# Altium footprint library USB Connectors.PcbLib: 40 footprints (part 3 of 3)
Each footprint in its own frame and in the unit in brackets; x right, y up, seen from the top. Pads: shape width x height; smd on the part's side, far side on the other; paste and mask are expansions set on the pad; w line width, h text height; cw(c..) or ccw(c..) is an arc to the next point about the centre after c.
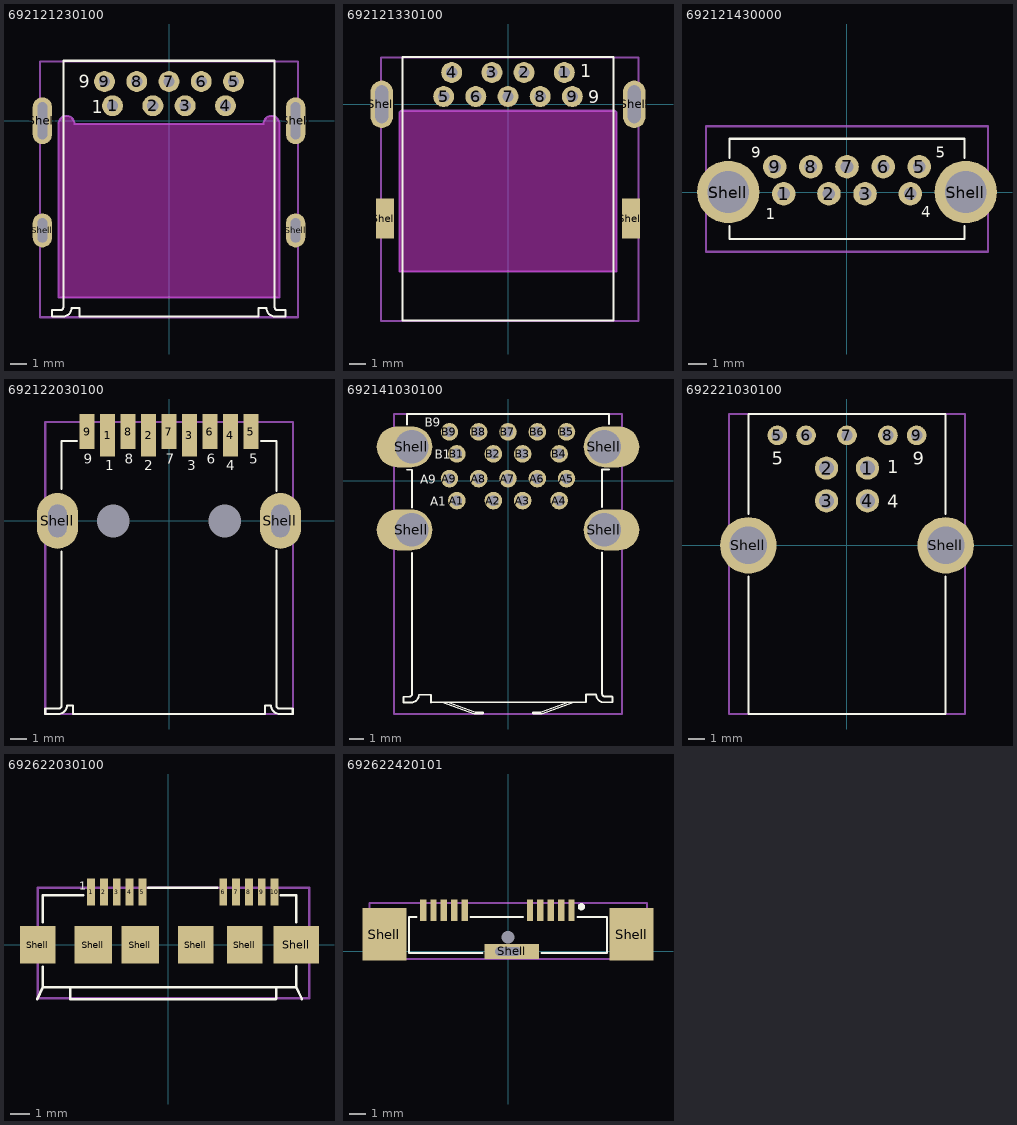
[diagram p2: the footprints below, top view; thin cyan lines are the x and y axes]

## 692121230100 [mm] "Receptacle Through hole Offset 1.04mm"
height 3.9
pads (13):
  round 1.3 hole 0.7: 1(-3.5,0.93) 2(-1,0.93) 3(1,0.93) 4(3.5,0.93) 5(4,2.43) 6(2,2.43) 7(0,2.43) 8(-2,2.43) 9(-4,2.43)
  oval 1.2x2.1 hole 0.6 slot 1.5 at 90 deg: Shell(-7.85,-6.8) Shell(7.85,-6.8)
  oval 1.2x2.9 hole 0.6 slot 2.3 at 90 deg: Shell(-7.85,0) Shell(7.85,0)
Top Overlay:
  lines w0.127: -7.25,-12.142 -6.577,-12.142 ccw(c-6.577,-11.616) -6.05,-11.616 -5.55,-11.616 -5.55,-12.15 5.55,-12.15 5.55,-11.616 6.05,-11.616 ccw(c6.576,-11.616) 6.576,-12.142 7.23,-12.142 7.23,-11.747 6.747,-11.747 cw(c6.747,-11.55) 6.55,-11.55 6.55,3.72 -6.55,3.72 -6.55,-11.55 cw(c-6.748,-11.55) -6.748,-11.747 -7.25,-11.747 -7.25,-12.142
  text "1" at -4.8,0.45 h0.8
  text "9" at -5.6,2.05 h0.8
Keep-Out Layer:
  board cut-out: -6.85,-10.97 6.85,-10.97 6.86,-0.2 6.821,-0.005 6.71,0.16 6.545,0.271 6.35,0.31 6.155,0.271 5.99,0.16 5.879,-0.005 5.84,-0.2 5.85,-0.2 -5.84,-0.2 -5.879,-0.005 -5.99,0.16 -6.155,0.271 -6.35,0.31 -6.545,0.271 -6.71,0.16 -6.821,-0.005 -6.86,-0.2 -6.85,-0.2
Mechanical 1:
  text "Milling Area" at -3.6,-6.77 h1.52
Mechanical 13:
  lines w0.127: -8,-12.185 8,-12.185 8,3.685 -8,3.685 -8,-12.185 ; -6.85,-10.97 6.85,-10.97 6.85,-0.2 ccw(c6.35,-0.2) 5.85,-0.2 -5.85,-0.2 ccw(c-6.35,-0.2) -6.85,-0.2 -6.85,-10.97
3D body: height 2.09, standoff -5.03, extent -8,-12.185 8,3.685

## 692121330100 [mm] "Receptacle TH Reverse Offset 1.75mm"
height 4.54
pads (13):
  round 1.3 hole 0.7: 1(3.5,1.98) 2(1,1.98) 3(-1,1.98) 4(-3.5,1.98) 5(-4,0.48) 6(-2,0.48) 7(0,0.48) 8(2,0.48) 9(4,0.48)
  oval 1.4x2.95 hole 0.8 slot 2.35 at 90 deg: Shell(-7.85,0) Shell(7.85,0)
  rect 1.1x2.5 smd: Shell(-7.65,-7.1) Shell(7.65,-7.1)
Top Overlay:
  lines w0.127: -6.55,-13.43 6.55,-13.43 ; -6.55,-13.43 6.55,-13.43 ; -6.55,-13.43 -6.55,2.94 ; -6.55,2.94 6.55,2.94 ; -6.55,2.94 6.55,2.94 ; 6.55,-13.43 6.55,2.94
  text "1" at 4.5,1.68 h0.8
  text "9" at 5,0.08 h0.8
Keep-Out Layer:
  board cut-out: -6.75,-10.4 -6.75,-0.57 -6.753,-0.57 -6.74,-0.504 -6.703,-0.447 -6.646,-0.41 -6.58,-0.397 -6.58,-0.4 6.58,-0.4 6.58,-0.397 6.646,-0.41 6.703,-0.447 6.74,-0.504 6.753,-0.57 6.75,-0.57 6.75,-10.4
Mechanical 1:
  text "Milling Area" at -3,-5.5 h1.52
Mechanical 13:
  lines w0.127: -7.9,-13.47 -7.9,2.9 8.1,2.9 8.1,-13.47 -7.9,-13.47 ; -6.75,-10.4 -6.75,-0.57 cw(c-6.58,-0.57) -6.58,-0.4 6.58,-0.4 cw(c6.58,-0.57) 6.75,-0.57 6.75,-10.4 -6.75,-10.4
3D body: height 2.95, standoff -4.45, extent -7.9,-13.47 8.1,2.9

## 692121430000 [mm] "Receptacle Through hole"
height 15
pads (11):
  round 1.3 hole 0.7: 1(-3.5,-0.1) 2(-1,-0.1) 3(1,-0.1) 4(3.5,-0.1) 5(4,1.4) 6(2,1.4) 7(0,1.4) 8(-2,1.4) 9(-4,1.4)
  round 3.45 hole 2.3: Shell(-6.57,0) Shell(6.57,0)
Top Overlay:
  lines w0.127: -6.5,-1.9 -6.5,-2.6 6.5,-2.6 6.5,-1.9 ; -6.5,1.9 -6.5,2.95 6.5,2.95 6.5,1.9
  text "9" at -5.3,1.9 h0.6
  text "5" at 4.9,1.9 h0.6
  text "4" at 4.1,-1.4 h0.6
  text "1" at -4.5,-1.5 h0.6
Mechanical 13:
  lines w0.127: -7.8,-3.3 7.8,-3.3 7.8,3.635 -7.799,3.635 -7.8,3.634 -7.8,-3.3
3D body: height 15.01, standoff -3.76, extent -7.799,-3.315 7.799,3.635

## 692122030100 [mm] "Receptacle Dual port TH"
height 6.99
pads (13):
  rect 0.9x2.6 smd: 1(-3.75,5.22) 2(-1.25,5.22) 3(1.25,5.22) 4(3.75,5.22)
  rect 0.9x2.15 smd: 5(5,5.445) 6(2.5,5.445) 7(0,5.445) 8(-2.5,5.445) 9(-5,5.445)
  oval 2.52x3.4 hole 1.12 slot 2 at 90 deg: Shell(-6.8,0) Shell(6.8,0)
  round 1.8 hole 2 unplated: ""(-3.4,0) ""(3.4,0)
Top Overlay:
  lines w0.127: -6.55,-1.867 -6.55,-11.251 cw(c-6.755,-11.251) -6.755,-11.456 -7.55,-11.456 -7.55,-11.777 -6.754,-11.777 ccw(c-6.754,-11.251) -6.228,-11.251 -5.85,-11.251 -5.85,-11.777 5.85,-11.777 5.85,-11.251 6.228,-11.251 ccw(c6.754,-11.251) 6.754,-11.777 7.55,-11.777 7.55,-11.456 6.755,-11.456 cw(c6.755,-11.251) 6.55,-11.251 6.55,-1.817 ; -6.55,1.932 -6.55,4.873 -5.6,4.873 ; 5.6,4.873 6.55,4.873 6.55,1.833
  text "1" at -3.9,3.1 h0.6
  text "2" at -1.5,3.1 h0.6
  text "3" at 1.1,3.1 h0.6
  text "4" at 3.5,3.1 h0.6
  text "5" at 4.9,3.5 h0.6
  text "6" at 2.3,3.5 h0.6
  text "7" at -0.2,3.5 h0.6
  text "8" at -2.7,3.5 h0.6
  text "9" at -5.2,3.5 h0.6
Mechanical 13:
  lines w0.127: -7.546,-11.78 -7.546,6.02 7.554,6.02 7.554,-11.774 7.55,-11.777 -7.544,-11.777 -7.546,-11.78
3D body: height 7.98, standoff -2.26, extent -7.546,-11.78 7.554,6.02

## 692141030100 [mm] "Receptacle Dual port TH"
height 13.62
pads (22):
  round 1.2 hole 0.7: A1(-3.5,-1.35) A2(-1,-1.35) A3(1,-1.35) A4(3.5,-1.35) A5(4,0.15) A6(2,0.15) A7(0,0.15) A8(-2,0.15) A9(-4,0.15) B1(-3.5,1.85) B2(-1,1.85) B3(1,1.85) B4(3.5,1.85) B5(4,3.35) B6(2,3.35) B7(0,3.35) B8(-2,3.35) B9(-4,3.35)
  oval 3.8x2.8 hole 2.3 copper offset -0.5,0: Shell(-6.57,-3.35) Shell(-6.57,2.33)
  oval 3.8x2.8 hole 2.3 copper offset 0.5,0: Shell(6.57,-3.35) Shell(6.57,2.33)
Top Overlay:
  lines w0.102: -4.506,-15.13 -2.325,-15.925 -1.75,-15.925 ccw(c-1.75,-15.862) -1.75,-15.8 -2.25,-15.8 -4.122,-15.13 ; 4.122,-15.13 2.25,-15.8 1.75,-15.8 ccw(c1.75,-15.862) 1.75,-15.925 2.325,-15.925 4.486,-15.13
  lines w0.127: -6.9,0.76 -6.55,0.76 -6.55,-1.82 ; -6.9,3.84 -6.9,4.57 6.9,4.57 6.9,3.88 ; -6.55,-4.91 -6.55,-14.55 cw(c-6.747,-14.55) -6.747,-14.747 -7.142,-14.747 -7.142,-15.142 -6.616,-15.142 ccw(c-6.616,-14.616) -6.089,-14.616 -5.262,-14.616 -5.262,-15.142 ; -5.25,-15.13 5.32,-15.13 5.32,-14.603 6.031,-14.603 ccw(c6.558,-14.603) 6.558,-15.13 7.15,-15.13 7.15,-14.801 ccw(c7.084,-14.801) 7.084,-14.735 6.623,-14.735 cw(c6.623,-14.538) 6.426,-14.538 6.426,-4.896 ; 6.426,-1.78 6.426,0.78 6.894,0.78
  text "A1" at -5.3,-1.7 h0.6
  text "A9" at -6,-0.2 h0.6
  text "B1" at -5,1.5 h0.6
  text "B9" at -5.7,3.7 h0.6
Mechanical 13:
  lines w0.127: -7.794,-15.93 7.794,-15.93 7.794,4.57 -7.794,4.57 -7.794,-15.93
3D body: height 16.11, standoff -3.5, extent -7.794,-15.93 7.794,4.57

## 692221030100 [mm] "Receptacle TH"
height 12.2
pads (11):
  round 1.42 hole 0.92: 1(1.25,4.71) 2(-1.25,4.71) 3(-1.25,2.71) 4(1.25,2.71)
  round 1.2 hole 0.7: 5(-4.25,6.71) 6(-2.5,6.71) 7(0,6.71) 8(2.5,6.71) 9(4.25,6.71)
  round 3.45 hole 2.3: Shell(-6.02,0) Shell(6.02,0)
Top Overlay:
  lines w0.127: -6,-1.9 -6,-10.29 6,-10.29 6,-1.9 ; -6,1.9 -6,8.01 6,8.01 6,1.9
  text "1" at 2.46,4.385 h0.8
  text "4" at 2.46,2.295 h0.8
  text "5" at -4.6,4.91 h0.8
  text "9" at 4,4.91 h0.8
Mechanical 13:
  lines w0.127: -7.2,-10.29 7.2,-10.29 7.2,8.01 -7.2,8.01 -7.2,-10.29
3D body: height 12.91, standoff -2.65, extent -7.199,-10.29 7.199,8.01

## 692622030100 [mm] "Receptacle SMT"
height 2.58
pads (16):
  rect 0.4x1.35 smd: 1(-3.9,2.675) 2(-3.25,2.675) 3(-2.6,2.675) 4(-1.95,2.675) 5(-1.3,2.675) 6(2.8,2.675) 7(3.45,2.675) 8(4.1,2.675) 9(4.75,2.675) 10(5.4,2.675)
  rect 1.8x1.9 smd: Shell(-6.6,0) Shell(1.4,0) Shell(3.9,0)
  rect 1.9x1.9 smd: Shell(-3.8,0) Shell(-1.4,0)
  rect 2.3x1.9 smd: Shell(6.5,0)
Top Overlay:
  lines w0.127: -6.625,-2.755 -6.34,-2.15 ; -6.34,-1.115 -6.34,-2.15 ; -6.34,1.135 -6.34,2.5 -4.3,2.5 ; -4.964,-2.154 -4.964,-2.762 -4.957,-2.755 5.46,-2.755 5.474,-2.741 5.474,-2.149 ; -1,2.893 2.5,2.893 ; 5.7,2.5 6.5,2.5 6.5,1.155 ; 6.5,-1.085 6.5,-2.15 ; 6.785,-2.755 6.5,-2.15 ; -6.34,-2.15 6.5,-2.15
  text "1" at -4.5,2.8 h0.4
Mechanical 13:
  lines w0.127: -6.595,-2.709 -6.595,2.893 7.147,2.893 7.147,-2.709 -6.595,-2.709
3D body: height 2.83, standoff -0.12, extent -6.595,-2.709 7.147,2.893

## 692622420101 [mm] "Micro Type B Vertical SMT - with Pads & positionning peg"
height 2.45
pads (15):
  rect 0.4x1.35 smd: 1(3.98,2.58) 2(3.33,2.58) 3(2.68,2.58) 4(2.03,2.58) 5(1.38,2.58) 6(-2.72,2.58) 7(-3.37,2.58) 8(-4.02,2.58) 9(-4.67,2.58) 10(-5.32,2.58)
  rect 2.75x3.3 smd: Shell(-7.75,1.08) Shell(7.75,1.08)
  rect 3.4x0.95 smd: Shell(0.23,0)
  round 0 hole 0.55 slot 1.6 at 0 deg paste-99: ""(0,0)
  round 0 hole 0.8 unplated: ""(0,0.89)
Top Overlay:
  circle w0.254: c4.6,2.8 r0.1
  lines w0.127: -5.75,2.15 -6.2,2.15 -6.2,0.875 -6.2,-0.1 -1.6,-0.1 ; -2.35,2.15 0.95,2.15 ; 2.1,-0.1 6.2,-0.1 6.2,2.15 4.35,2.15
Mechanical 13:
  lines w0.127: -8.675,-0.475 -8.675,3.025 8.725,3.025 8.725,-0.475 -8.675,-0.475
3D body: height 5.82, standoff -0.83, extent -8.675,-0.475 8.725,3.025